# Altium footprint library con-amp.PCBLIB: 295 footprints (part 13 of 19) (continued)
## 63825804 [mil] (continued)
  lines w12: -2070,-303 2070,-303 2070,-230 ; -2070,-300 -2070,-50 ; -2070,50 -2070,305 2070,305 2070,230 ; 1895,-230 2070,-230 ; 1895,-70 2070,-70 ; 1895,70 2070,70 ; 1895,230 2070,230 ; 2070,-230 2070,-185 2070,-115 2070,-70 ; 2070,-70 2070,70 ; 2070,70 2070,115 2070,185 2070,230
Mechanical 16:
  lines w10: -1765,-185 -75,-185 ; -1765,-115 -75,-115 ; -1765,115 -75,115 ; -1765,185 -75,185 ; 75,-185 1765,-185 ; 75,-115 1765,-115 ; 75,115 1765,115 ; 75,185 1765,185

## 63827658 [mil]
pads (139):
  round 62 hole 62: 1(-2100,0)
  round 48 hole 32: 1(-1775,-37.5)
  round 93 hole 93: 1(0,0) 1(2100,0)
  oct 48x48 hole 32: 2(-1725,-112.5) 3(-1675,-37.5) 4(-1625,-112.5) 5(-1575,-37.5) 6(-1525,-112.5) 7(-1475,-37.5) 8(-1425,-112.5) 9(-1375,-37.5) 10(-1325,-112.5) 11(-1275,-37.5) 12(-1225,-112.5) 13(-1175,-37.5) 14(-1125,-112.5) 15(-1075,-37.5) 16(-1025,-112.5) 17(-975,-37.5) 18(-925,-112.5) 19(-875,-37.5) 20(-825,-112.5) 21(-775,-37.5) 22(-725,-112.5) 23(-675,-37.5) 24(-625,-112.5) 25(-575,-37.5) 26(-525,-112.5) 27(-475,-37.5) 28(-425,-112.5) 29(-375,-37.5) 30(-325,-112.5) 31(-275,-37.5) 32(-225,-112.5) 33(-175,-37.5) 34(-125,-112.5) 35(125,-37.5) 36(175,-112.5) 37(225,-37.5) 38(275,-112.5) 39(325,-37.5) 40(375,-112.5) 41(425,-37.5) 42(475,-112.5) 43(525,-37.5) 44(575,-112.5) 45(625,-37.5) 46(675,-112.5) 47(725,-37.5) 48(775,-112.5) 49(825,-37.5) 50(875,-112.5) 51(925,-37.5) 52(975,-112.5) 53(1025,-37.5) 54(1075,-112.5) 55(1125,-37.5) 56(1175,-112.5) 57(1225,-37.5) 58(1275,-112.5) 59(1325,-37.5) 60(1375,-112.5) 61(1425,-37.5) 62(1475,-112.5) 63(1525,-37.5) 64(1575,-112.5) 65(1625,-37.5) 66(1675,-112.5) 67(1725,-37.5) 68(1775,-112.5) 69(-1775,112.5) 70(-1725,37.5) 71(-1675,112.5) 72(-1625,37.5) 73(-1575,112.5) 74(-1525,37.5) 75(-1475,112.5) 76(-1425,37.5) 77(-1375,112.5) 78(-1325,37.5) 79(-1275,112.5) 80(-1225,37.5) 81(-1175,112.5) 82(-1125,37.5) 83(-1075,112.5) 84(-1025,37.5) 85(-975,112.5) 86(-925,37.5) 87(-875,112.5) 88(-825,37.5) 89(-775,112.5) 90(-725,37.5) 91(-675,112.5) 92(-625,37.5) 93(-575,112.5) 94(-525,37.5) 95(-475,112.5) 96(-425,37.5) 97(-375,112.5) 98(-325,37.5) 99(-275,112.5) 100(-225,37.5) 101(-175,112.5) 102(-125,37.5) 103(125,112.5) 104(175,37.5) 105(225,112.5) 106(275,37.5) 107(325,112.5) 108(375,37.5) 109(425,112.5) 110(475,37.5) 111(525,112.5) 112(575,37.5) 113(625,112.5) 114(675,37.5) 115(725,112.5) 116(775,37.5) 117(825,112.5) 118(875,37.5) 119(925,112.5) 120(975,37.5) 121(1025,112.5) 122(1075,37.5) 123(1125,112.5) 124(1175,37.5) 125(1225,112.5) 126(1275,37.5) 127(1325,112.5) 128(1375,37.5) 129(1425,112.5) 130(1475,37.5) 131(1525,112.5) 132(1575,37.5) 133(1625,112.5) 134(1675,37.5) 135(1725,112.5) 136(1775,37.5)
Top Overlay:
  lines w10: -2170,-35 -1870,-35 ; -2170,35 -1870,35 ; -1867,-150 -1867,-35 ; -1867,35 -1867,152 ; 1867,-150 1867,-35 ; 1867,35 1867,152 ; 1870,-35 2170,-35 ; 1870,35 2170,35 ; 2175,-65 2370,-65 2370,65 2175,65 ; -55,-100 -60,-100 cw(c-60,-85) -75,-85 -75,85 cw(c-60,85) -60,100 -55,100 ; -55,-100 0,-100 ; -55,-100 -55,100 ; -55,100 0,100 ; 0,-100 60,-100 ccw(c60,-85) 75,-85 75,85 ccw(c60,85) 60,100 0,100 ; 0,-100 0,100
  lines w12: -1870,-80 -2170,-80 ; -1870,80 -2170,80 ; 1870,-80 2170,-80 ; 1870,80 2170,80 ; -2170,-80 -2170,-35 -2170,35 -2170,80 ; -2170,-80 -2170,-153 2170,-153 2170,-80 ; -2170,80 -2170,155 2170,155 2170,80 ; 2170,-80 2170,-35 2170,35 2170,80
Mechanical 16:
  lines w10: -1865,-35 -75,-35 ; -1865,35 -75,35 ; 75,-35 2165,-35 ; 75,35 1865,35

## 63827818 [mil]
pads (139):
  round 62 hole 62: 1(-2100,0)
  round 48 hole 32: 1(-1775,-37.5)
  round 93 hole 93: 1(0,0) 1(2100,0)
  oct 48x48 hole 32: 2(-1725,-112.5) 3(-1675,-37.5) 4(-1625,-112.5) 5(-1575,-37.5) 6(-1525,-112.5) 7(-1475,-37.5) 8(-1425,-112.5) 9(-1375,-37.5) 10(-1325,-112.5) 11(-1275,-37.5) 12(-1225,-112.5) 13(-1175,-37.5) 14(-1125,-112.5) 15(-1075,-37.5) 16(-1025,-112.5) 17(-975,-37.5) 18(-925,-112.5) 19(-875,-37.5) 20(-825,-112.5) 21(-775,-37.5) 22(-725,-112.5) 23(-675,-37.5) 24(-625,-112.5) 25(-575,-37.5) 26(-525,-112.5) 27(-475,-37.5) 28(-425,-112.5) 29(-375,-37.5) 30(-325,-112.5) 31(-275,-37.5) 32(-225,-112.5) 33(-175,-37.5) 34(-125,-112.5) 35(125,-37.5) 36(175,-112.5) 37(225,-37.5) 38(275,-112.5) 39(325,-37.5) 40(375,-112.5) 41(425,-37.5) 42(475,-112.5) 43(525,-37.5) 44(575,-112.5) 45(625,-37.5) 46(675,-112.5) 47(725,-37.5) 48(775,-112.5) 49(825,-37.5) 50(875,-112.5) 51(925,-37.5) 52(975,-112.5) 53(1025,-37.5) 54(1075,-112.5) 55(1125,-37.5) 56(1175,-112.5) 57(1225,-37.5) 58(1275,-112.5) 59(1325,-37.5) 60(1375,-112.5) 61(1425,-37.5) 62(1475,-112.5) 63(1525,-37.5) 64(1575,-112.5) 65(1625,-37.5) 66(1675,-112.5) 67(1725,-37.5) 68(1775,-112.5) 69(-1775,112.5) 70(-1725,37.5) 71(-1675,112.5) 72(-1625,37.5) 73(-1575,112.5) 74(-1525,37.5) 75(-1475,112.5) 76(-1425,37.5) 77(-1375,112.5) 78(-1325,37.5) 79(-1275,112.5) 80(-1225,37.5) 81(-1175,112.5) 82(-1125,37.5) 83(-1075,112.5) 84(-1025,37.5) 85(-975,112.5) 86(-925,37.5) 87(-875,112.5) 88(-825,37.5) 89(-775,112.5) 90(-725,37.5) 91(-675,112.5) 92(-625,37.5) 93(-575,112.5) 94(-525,37.5) 95(-475,112.5) 96(-425,37.5) 97(-375,112.5) 98(-325,37.5) 99(-275,112.5) 100(-225,37.5) 101(-175,112.5) 102(-125,37.5) 103(125,112.5) 104(175,37.5) 105(225,112.5) 106(275,37.5) 107(325,112.5) 108(375,37.5) 109(425,112.5) 110(475,37.5) 111(525,112.5) 112(575,37.5) 113(625,112.5) 114(675,37.5) 115(725,112.5) 116(775,37.5) 117(825,112.5) 118(875,37.5) 119(925,112.5) 120(975,37.5) 121(1025,112.5) 122(1075,37.5) 123(1125,112.5) 124(1175,37.5) 125(1225,112.5) 126(1275,37.5) 127(1325,112.5) 128(1375,37.5) 129(1425,112.5) 130(1475,37.5) 131(1525,112.5) 132(1575,37.5) 133(1625,112.5) 134(1675,37.5) 135(1725,112.5) 136(1775,37.5)
Top Overlay:
  lines w6: -2290,-85 -2215,-85 -2215,-105 -2205,-105 -2205,-55 -2215,-55 -2215,-75 -2290,-75 -2290,-85 ; -2290,0 -2245,0 -2245,-25 -2235,-25 -2235,0 -2215,0 -2215,-35 -2205,-35 -2205,10 -2290,10 -2290,0 ; -2290,30 -2290,40 -2205,40 -2205,30 -2290,30 ; -2290,60 -2290,105 -2205,105 -2205,95 -2280,95 -2280,60 -2290,60 ; 2205,-105 2205,-95 2280,-95 2280,-60 2290,-60 2290,-105 2205,-105 ; 2205,-40 2205,-30 2290,-30 2290,-40 2205,-40 ; 2205,-10 2290,-10 2290,0 2245,0 2245,25 2235,25 2235,0 2215,0 2215,35 2205,35 2205,-10 ; 2205,55 2205,105 2215,105 2215,85 2290,85 2290,75 2215,75 2215,55 2205,55
  lines w10: -2307,-135 -2307,140 ; -2305,-135 -2185,-135 -2185,-65 -2010,-65 -2010,-35 -2170,-35 -2170,35 -2010,35 -2010,65 -2185,65 -2185,140 -2305,140 ; -2005,-35 -1870,-35 ; -2005,35 -1870,35 ; -1992,-150 -1992,-35 ; -1992,35 -1992,152 ; -1867,-150 -1867,-35 ; -1867,35 -1867,152 ; 1867,-150 1867,-35 ; 1867,35 1867,152 ; 1870,-35 2005,-35 ; 1870,35 2005,35 ; 1992,-152 1992,-35 ; 1992,35 1992,150 ; 2305,-140 2185,-140 2185,-65 2010,-65 2010,-35 2170,-35 2170,35 2010,35 2010,65 2185,65 2185,135 2305,135 ; 2307,-140 2307,135 ; -75,-100 -75,100 75,100 75,-100 -75,-100 ; -55,-15 -55,15 -15,15 -15,55 15,55 15,15 55,15 55,-15 15,-15 15,-55 -15,-55 -15,-15 -55,-15
  lines w12: -2170,-153 2170,-153 ; -2170,-150 -2170,-80 -1995,-80 ; -1995,80 -2170,80 -2170,155 2170,155 ; 1995,-80 2170,-80 2170,-155 ; 1995,80 2170,80 2170,150
Mechanical 16:
  lines w10: -1865,-35 -75,-35 ; -1865,35 -75,35 ; 75,-35 1865,-35 ; 75,35 1865,35

## 63827844 [mil]
pads (131):
  round 62 hole 62: 1(-2000,0)
  round 48 hole 32: 1(-1675,-37.5)
  round 93 hole 93: 1(0,0) 1(2000,0)
  oct 48x48 hole 32: 2(-1625,-112.5) 3(-1575,-37.5) 4(-1525,-112.5) 5(-1475,-37.5) 6(-1425,-112.5) 7(-1375,-37.5) 8(-1325,-112.5) 9(-1275,-37.5) 10(-1225,-112.5) 11(-1175,-37.5) 12(-1125,-112.5) 13(-1075,-37.5) 14(-1025,-112.5) 15(-975,-37.5) 16(-925,-112.5) 17(-875,-37.5) 18(-825,-112.5) 19(-775,-37.5) 20(-725,-112.5) 21(-675,-37.5) 22(-625,-112.5) 23(-575,-37.5) 24(-525,-112.5) 25(-475,-37.5) 26(-425,-112.5) 27(-375,-37.5) 28(-325,-112.5) 29(-275,-37.5) 30(-225,-112.5) 31(-175,-37.5) 32(-125,-112.5) 33(125,-37.5) 34(175,-112.5) 35(225,-37.5) 36(275,-112.5) 37(325,-37.5) 38(375,-112.5) 39(425,-37.5) 40(475,-112.5) 41(525,-37.5) 42(575,-112.5) 43(625,-37.5) 44(675,-112.5) 45(725,-37.5) 46(775,-112.5) 47(825,-37.5) 48(875,-112.5) 49(925,-37.5) 50(975,-112.5) 51(1025,-37.5) 52(1075,-112.5) 53(1125,-37.5) 54(1175,-112.5) 55(1225,-37.5) 56(1275,-112.5) 57(1325,-37.5) 58(1375,-112.5) 59(1425,-37.5) 60(1475,-112.5) 61(1525,-37.5) 62(1575,-112.5) 63(1625,-37.5) 64(1675,-112.5) 65(-1675,112.5) 66(-1625,37.5) 67(-1575,112.5) 68(-1525,37.5) 69(-1475,112.5) 70(-1425,37.5) 71(-1375,112.5) 72(-1325,37.5) 73(-1275,112.5) 74(-1225,37.5) 75(-1175,112.5) 76(-1125,37.5) 77(-1075,112.5) 78(-1025,37.5) 79(-975,112.5) 80(-925,37.5) 81(-875,112.5) 82(-825,37.5) 83(-775,112.5) 84(-725,37.5) 85(-675,112.5) 86(-625,37.5) 87(-575,112.5) 88(-525,37.5) 89(-475,112.5) 90(-425,37.5) 91(-375,112.5) 92(-325,37.5) 93(-275,112.5) 94(-225,37.5) 95(-175,112.5) 96(-125,37.5) 97(125,112.5) 98(175,37.5) 99(225,112.5) 100(275,37.5) 101(325,112.5) 102(375,37.5) 103(425,112.5) 104(475,37.5) 105(525,112.5) 106(575,37.5) 107(625,112.5) 108(675,37.5) 109(725,112.5) 110(775,37.5) 111(825,112.5) 112(875,37.5) 113(925,112.5) 114(975,37.5) 115(1025,112.5) 116(1075,37.5) 117(1125,112.5) 118(1175,37.5) 119(1225,112.5) 120(1275,37.5) 121(1325,112.5) 122(1375,37.5) 123(1425,112.5) 124(1475,37.5) 125(1525,112.5) 126(1575,37.5) 127(1625,112.5) 128(1675,37.5)
Top Overlay:
  lines w10: -2070,-35 -1770,-35 ; -2070,35 -1770,35 ; -1892,-150 -1892,-35 ; -1892,35 -1892,152 ; -1767,-150 -1767,-35 ; -1767,35 -1767,152 ; 1767,-150 1767,-35 ; 1767,35 1767,152 ; 1770,-35 2070,-35 ; 1770,35 2070,35 ; 1892,-150 1892,-35 ; 1892,35 1892,152 ; -75,-100 -75,100 75,100 75,-100 -75,-100 ; -55,-15 -55,15 -15,15 -15,55 15,55 15,15 55,15 55,-15 15,-15 15,-55 -15,-55 -15,-15 -55,-15
  lines w12: -2070,-153 2070,-153 2070,-80 ; -2070,-150 -2070,155 2070,155 2070,80 ; -2065,-80 -1895,-80 ; -2065,80 -1895,80 ; 1895,-80 2070,-80 ; 1895,80 2070,80 ; 2070,-80 2070,-35 2070,35 2070,80
Mechanical 16:
  lines w10: -1765,-35 -75,-35 ; -1765,35 -75,35 ; 75,-35 2065,-35 ; 75,35 2065,35

## 63827848 [mil]
pads (139):
  round 62 hole 62: 1(-2100,0)
  round 48 hole 32: 1(-1775,-37.5)
  round 93 hole 93: 1(0,0) 1(2100,0)
  oct 48x48 hole 32: 2(-1725,-112.5) 3(-1675,-37.5) 4(-1625,-112.5) 5(-1575,-37.5) 6(-1525,-112.5) 7(-1475,-37.5) 8(-1425,-112.5) 9(-1375,-37.5) 10(-1325,-112.5) 11(-1275,-37.5) 12(-1225,-112.5) 13(-1175,-37.5) 14(-1125,-112.5) 15(-1075,-37.5) 16(-1025,-112.5) 17(-975,-37.5) 18(-925,-112.5) 19(-875,-37.5) 20(-825,-112.5) 21(-775,-37.5) 22(-725,-112.5) 23(-675,-37.5) 24(-625,-112.5) 25(-575,-37.5) 26(-525,-112.5) 27(-475,-37.5) 28(-425,-112.5) 29(-375,-37.5) 30(-325,-112.5) 31(-275,-37.5) 32(-225,-112.5) 33(-175,-37.5) 34(-125,-112.5) 35(125,-37.5) 36(175,-112.5) 37(225,-37.5) 38(275,-112.5) 39(325,-37.5) 40(375,-112.5) 41(425,-37.5) 42(475,-112.5) 43(525,-37.5) 44(575,-112.5) 45(625,-37.5) 46(675,-112.5) 47(725,-37.5) 48(775,-112.5) 49(825,-37.5) 50(875,-112.5) 51(925,-37.5) 52(975,-112.5) 53(1025,-37.5) 54(1075,-112.5) 55(1125,-37.5) 56(1175,-112.5) 57(1225,-37.5) 58(1275,-112.5) 59(1325,-37.5) 60(1375,-112.5) 61(1425,-37.5) 62(1475,-112.5) 63(1525,-37.5) 64(1575,-112.5) 65(1625,-37.5) 66(1675,-112.5) 67(1725,-37.5) 68(1775,-112.5) 69(-1775,112.5) 70(-1725,37.5) 71(-1675,112.5) 72(-1625,37.5) 73(-1575,112.5) 74(-1525,37.5) 75(-1475,112.5) 76(-1425,37.5) 77(-1375,112.5) 78(-1325,37.5) 79(-1275,112.5) 80(-1225,37.5) 81(-1175,112.5) 82(-1125,37.5) 83(-1075,112.5) 84(-1025,37.5) 85(-975,112.5) 86(-925,37.5) 87(-875,112.5) 88(-825,37.5) 89(-775,112.5) 90(-725,37.5) 91(-675,112.5) 92(-625,37.5) 93(-575,112.5) 94(-525,37.5) 95(-475,112.5) 96(-425,37.5) 97(-375,112.5) 98(-325,37.5) 99(-275,112.5) 100(-225,37.5) 101(-175,112.5) 102(-125,37.5) 103(125,112.5) 104(175,37.5) 105(225,112.5) 106(275,37.5) 107(325,112.5) 108(375,37.5) 109(425,112.5) 110(475,37.5) 111(525,112.5) 112(575,37.5) 113(625,112.5) 114(675,37.5) 115(725,112.5) 116(775,37.5) 117(825,112.5) 118(875,37.5) 119(925,112.5) 120(975,37.5) 121(1025,112.5) 122(1075,37.5) 123(1125,112.5) 124(1175,37.5) 125(1225,112.5) 126(1275,37.5) 127(1325,112.5) 128(1375,37.5) 129(1425,112.5) 130(1475,37.5) 131(1525,112.5) 132(1575,37.5) 133(1625,112.5) 134(1675,37.5) 135(1725,112.5) 136(1775,37.5)
Top Overlay:
  lines w10: -2170,-35 -1870,-35 ; -2170,35 -1870,35 ; -1992,-150 -1992,-35 ; -1992,35 -1992,152 ; -1867,-150 -1867,-35 ; -1867,35 -1867,152 ; 1867,-150 1867,-35 ; 1867,35 1867,152 ; 1870,-35 2170,-35 ; 1870,35 2170,35 ; 1992,-150 1992,-35 ; 1992,35 1992,152 ; -75,-100 -75,100 75,100 75,-100 -75,-100 ; -55,-15 -55,15 -15,15 -15,55 15,55 15,15 55,15 55,-15 15,-15 15,-55 -15,-55 -15,-15 -55,-15
  lines w12: -2170,-153 2170,-153 2170,-80 ; -2170,-150 -2170,155 2170,155 2170,80 ; -2165,-80 -1995,-80 ; -2165,80 -1995,80 ; 1995,-80 2170,-80 ; 1995,80 2170,80 ; 2170,-80 2170,-35 2170,35 2170,80
Mechanical 16:
  lines w10: -1865,-35 -75,-35 ; -1865,35 -75,35 ; 75,-35 2165,-35 ; 75,35 2165,35

## 73824812 [mil]
pads (75):
  round 96 hole 96: 1(-2200,-100) 1(0,-100)
  round 60 hole 40: 1(1875,-50)
  round 62 hole 62: 1(2200,-100)
  oct 60x60 hole 40: 2(1825,50) 3(1775,-50) 4(1725,50) 5(1675,-50) 6(1625,50) 7(1575,-50) 8(1525,50) 9(1475,-50) 10(1425,50) 11(1375,-50) 12(1325,50) 13(1275,-50) 14(1225,50) 15(1175,-50) 16(1125,50) 17(1075,-50) 18(1025,50) 19(975,-50) 20(925,50) 21(875,-50) 22(825,50) 23(775,-50) 24(725,50) 25(675,-50) 26(625,50) 27(575,-50) 28(525,50) 29(475,-50) 30(425,50) 31(375,-50) 32(325,50) 33(275,-50) 34(225,50) 35(175,-50) 36(125,50) 37(-125,-50) 38(-175,50) 39(-225,-50) 40(-275,50) 41(-325,-50) 42(-375,50) 43(-425,-50) 44(-475,50) 45(-525,-50) 46(-575,50) 47(-625,-50) 48(-675,50) 49(-725,-50) 50(-775,50) 51(-825,-50) 52(-875,50) 53(-925,-50) 54(-975,50) 55(-1025,-50) 56(-1075,50) 57(-1125,-50) 58(-1175,50) 59(-1225,-50) 60(-1275,50) 61(-1325,-50) 62(-1375,50) 63(-1425,-50) 64(-1475,50) 65(-1525,-50) 66(-1575,50) 67(-1625,-50) 68(-1675,50) 69(-1725,-50) 70(-1775,50) 71(-1825,-50) 72(-1875,50)
Top Overlay:
  rectangle: 2060,-245 2075,-155
  lines w6: -2140,-435 -2140,-430 -2140,-155 -1940,-155 ; -2110,-460 -2070,-500 -2070,-600 ; -2035,-600 -2035,-515 -1940,-515 ; 1940,-515 2035,-515 2035,-600 ; 1940,-155 2140,-155 2140,-430 ; 2070,-600 2070,-500 2110,-460
  lines w10: 1950,98 -2270,98 -2270,-602 -2235,-602 -2235,-430 -2140,-430 -2110,-460 -2150,-500 -2150,-602 -1940,-602 -1940,-515 -1940,-157 1940,-157 1940,-515 1940,-602 2150,-602 2150,-500 2110,-460 2140,-430 2235,-430 2235,-602 2270,-602 2270,98 2050,98
  lines w12: 1950,96.06 ccw(c2000,106.06) 2050,96.06

## 73824862 [mil]
pads (75):
  round 96 hole 96: 1(-2200,-100) 1(0,-100)
  round 60 hole 40: 1(1875,-50)
  round 62 hole 62: 1(2200,-100)
  oct 60x60 hole 40: 2(1825,50) 3(1775,-50) 4(1725,50) 5(1675,-50) 6(1625,50) 7(1575,-50) 8(1525,50) 9(1475,-50) 10(1425,50) 11(1375,-50) 12(1325,50) 13(1275,-50) 14(1225,50) 15(1175,-50) 16(1125,50) 17(1075,-50) 18(1025,50) 19(975,-50) 20(925,50) 21(875,-50) 22(825,50) 23(775,-50) 24(725,50) 25(675,-50) 26(625,50) 27(575,-50) 28(525,50) 29(475,-50) 30(425,50) 31(375,-50) 32(325,50) 33(275,-50) 34(225,50) 35(175,-50) 36(125,50) 37(-125,-50) 38(-175,50) 39(-225,-50) 40(-275,50) 41(-325,-50) 42(-375,50) 43(-425,-50) 44(-475,50) 45(-525,-50) 46(-575,50) 47(-625,-50) 48(-675,50) 49(-725,-50) 50(-775,50) 51(-825,-50) 52(-875,50) 53(-925,-50) 54(-975,50) 55(-1025,-50) 56(-1075,50) 57(-1125,-50) 58(-1175,50) 59(-1225,-50) 60(-1275,50) 61(-1325,-50) 62(-1375,50) 63(-1425,-50) 64(-1475,50) 65(-1525,-50) 66(-1575,50) 67(-1625,-50) 68(-1675,50) 69(-1725,-50) 70(-1775,50) 71(-1825,-50) 72(-1875,50)
Top Overlay:
  rectangle: 2060,-245 2075,-155
  lines w6: -2140,-330 -2140,-155 -1940,-155 ; -2110,-360 -2070,-400 -2070,-500 ; -2035,-500 -2035,-415 -1940,-415 ; 1940,-415 2035,-415 2035,-500 ; 1940,-155 2140,-155 2140,-330 ; 2070,-500 2070,-400 2110,-360
  lines w10: 1950,98 -2270,98 -2270,-502 -2235,-502 -2235,-330 -2140,-330 -2110,-360 -2150,-400 -2150,-502 -1940,-502 -1940,-415 -1940,-157 1940,-157 1940,-415 1940,-502 2150,-502 2150,-400 2110,-360 2140,-330 2235,-330 2235,-502 2270,-502 2270,98 2050,98
  lines w12: 1950,96.06 ccw(c2000,106.06) 2050,96.06

## 73826962 [mil]
pads (75):
  round 93 hole 93: 1(-2200,0)
  round 100 hole 100: 1(0,0)
  round 60 hole 40: 1(1875,-50)
  round 62 hole 62: 1(2200,0)
  oct 60x60 hole 40: 2(1825,50) 3(1775,-50) 4(1725,50) 5(1675,-50) 6(1625,50) 7(1575,-50) 8(1525,50) 9(1475,-50) 10(1425,50) 11(1375,-50) 12(1325,50) 13(1275,-50) 14(1225,50) 15(1175,-50) 16(1125,50) 17(1075,-50) 18(1025,50) 19(975,-50) 20(925,50) 21(875,-50) 22(825,50) 23(775,-50) 24(725,50) 25(675,-50) 26(625,50) 27(575,-50) 28(525,50) 29(475,-50) 30(425,50) 31(375,-50) 32(325,50) 33(275,-50) 34(225,50) 35(175,-50) 36(125,50) 37(-125,-50) 38(-175,50) 39(-225,-50) 40(-275,50) 41(-325,-50) 42(-375,50) 43(-425,-50) 44(-475,50) 45(-525,-50) 46(-575,50) 47(-625,-50) 48(-675,50) 49(-725,-50) 50(-775,50) 51(-825,-50) 52(-875,50) 53(-925,-50) 54(-975,50) 55(-1025,-50) 56(-1075,50) 57(-1125,-50) 58(-1175,50) 59(-1225,-50) 60(-1275,50) 61(-1325,-50) 62(-1375,50) 63(-1425,-50) 64(-1475,50) 65(-1525,-50) 66(-1575,50) 67(-1625,-50) 68(-1675,50) 69(-1725,-50) 70(-1775,50) 71(-1825,-50) 72(-1875,50)
Top Overlay:
  lines w6: -2150,-25 -2150,75 -1950,75 -1950,-65 -2035,-65 -2035,-25 -2150,-25 ; 1950,-65 1950,75 2150,75 2150,-25 2035,-25 2035,-65 1950,-65
  lines w10: -2270,-187 -1940,-187 -1940,-207 1940,-207 1940,-187 2270,-187 2270,98 1935,98 1935,78 -1935,78 -1935,98 -2270,98 -2270,-187
  lines w16: -2175,-245 -2095,-180 ccw(c-2132.5,-139.87) -2130,-85 -2160,-85 -2160,85 -2075,85 ; 2075,85 2160,85 2160,-85 2130,-85 ccw(c2132.5,-139.87) 2095,-180 2175,-245
Mechanical 16:
  lines w6: -2270,-30 -2170,-30 ; -2270,30 -2170,30 ; -1945,-30 -62,-30 ; -1945,30 -62,30 ; 1945,-30 62,-30 ; 1945,30 62,30 ; 2170,-30 2270,-30 ; 2170,30 2270,30 ; -62,-30 62,-30 ; -62,-30 -62,30 ; -62,30 62,30 ; 62,-30 62,30

## 73826982 [mil]
pads (75):
  round 57 hole 57: 1(-2200,0) 1(2200,0)
  round 60 hole 40: 1(-1875,50)
  round 100 hole 100: 1(0,0)
  oct 60x60 hole 40: 2(-1825,-50) 3(-1775,50) 4(-1725,-50) 5(-1675,50) 6(-1625,-50) 7(-1575,50) 8(-1525,-50) 9(-1475,50) 10(-1425,-50) 11(-1375,50) 12(-1325,-50) 13(-1275,50) 14(-1225,-50) 15(-1175,50) 16(-1125,-50) 17(-1075,50) 18(-1025,-50) 19(-975,50) 20(-925,-50) 21(-875,50) 22(-825,-50) 23(-775,50) 24(-725,-50) 25(-675,50) 26(-625,-50) 27(-575,50) 28(-525,-50) 29(-475,50) 30(-425,-50) 31(-375,50) 32(-325,-50) 33(-275,50) 34(-225,-50) 35(-175,50) 36(-125,-50) 37(125,50) 38(175,-50) 39(225,50) 40(275,-50) 41(325,50) 42(375,-50) 43(425,50) 44(475,-50) 45(525,50) 46(575,-50) 47(625,50) 48(675,-50) 49(725,50) 50(775,-50) 51(825,50) 52(875,-50) 53(925,50) 54(975,-50) 55(1025,50) 56(1075,-50) 57(1125,50) 58(1175,-50) 59(1225,50) 60(1275,-50) 61(1325,50) 62(1375,-50) 63(1425,50) 64(1475,-50) 65(1525,50) 66(1575,-50) 67(1625,50) 68(1675,-50) 69(1725,50) 70(1775,-50) 71(1825,50) 72(1875,-50)
Top Overlay:
  lines w6: -2150,-25 -2150,75 -1950,75 -1950,-65 -2035,-65 -2035,-25 -2150,-25 ; 1950,-65 1950,75 2150,75 2150,-25 2035,-25 2035,-65 1950,-65
  lines w10: -2270,-187 -1940,-187 -1940,-207 1940,-207 1940,-187 2270,-187 2270,98 1935,98 1935,78 -1935,78 -1935,98 -2270,98 -2270,-187
  lines w16: -2175,-245 -2095,-180 ccw(c-2132.5,-139.87) -2130,-85 -2160,-85 -2160,85 -2075,85 ; 2075,85 2160,85 2160,-85 2130,-85 ccw(c2132.5,-139.87) 2095,-180 2175,-245
Mechanical 16:
  lines w6: -2270,-30 -2170,-30 ; -2270,30 -2170,30 ; -1945,-30 -62,-30 ; -1945,30 -62,30 ; 1945,-30 62,-30 ; 1945,30 62,30 ; 2170,-30 2270,-30 ; 2170,30 2270,30 ; -62,-30 62,-30 ; -62,-30 -62,30 ; -62,30 62,30 ; 62,-30 62,30

## 73827652 [mil]
pads (147):
  round 62 hole 62: 1(-2200,0)
  round 48 hole 32: 1(-1875,-37.5)
  round 93 hole 93: 1(0,0) 1(2200,0)
  oct 48x48 hole 32: 2(-1825,-112.5) 3(-1775,-37.5) 4(-1725,-112.5) 5(-1675,-37.5) 6(-1625,-112.5) 7(-1575,-37.5) 8(-1525,-112.5) 9(-1475,-37.5) 10(-1425,-112.5) 11(-1375,-37.5) 12(-1325,-112.5) 13(-1275,-37.5) 14(-1225,-112.5) 15(-1175,-37.5) 16(-1125,-112.5) 17(-1075,-37.5) 18(-1025,-112.5) 19(-975,-37.5) 20(-925,-112.5) 21(-875,-37.5) 22(-825,-112.5) 23(-775,-37.5) 24(-725,-112.5) 25(-675,-37.5) 26(-625,-112.5) 27(-575,-37.5) 28(-525,-112.5) 29(-475,-37.5) 30(-425,-112.5) 31(-375,-37.5) 32(-325,-112.5) 33(-275,-37.5) 34(-225,-112.5) 35(-175,-37.5) 36(-125,-112.5) 37(125,-37.5) 38(175,-112.5) 39(225,-37.5) 40(275,-112.5) 41(325,-37.5) 42(375,-112.5) 43(425,-37.5) 44(475,-112.5) 45(525,-37.5) 46(575,-112.5) 47(625,-37.5) 48(675,-112.5) 49(725,-37.5) 50(775,-112.5) 51(825,-37.5) 52(875,-112.5) 53(925,-37.5) 54(975,-112.5) 55(1025,-37.5) 56(1075,-112.5) 57(1125,-37.5) 58(1175,-112.5) 59(1225,-37.5) 60(1275,-112.5) 61(1325,-37.5) 62(1375,-112.5) 63(1425,-37.5) 64(1475,-112.5) 65(1525,-37.5) 66(1575,-112.5) 67(1625,-37.5) 68(1675,-112.5) 69(1725,-37.5) 70(1775,-112.5) 71(1825,-37.5) 72(1875,-112.5) 73(-1875,112.5) 74(-1825,37.5) 75(-1775,112.5) 76(-1725,37.5) 77(-1675,112.5) 78(-1625,37.5) 79(-1575,112.5) 80(-1525,37.5) 81(-1475,112.5) 82(-1425,37.5) 83(-1375,112.5) 84(-1325,37.5) 85(-1275,112.5) 86(-1225,37.5) 87(-1175,112.5) 88(-1125,37.5) 89(-1075,112.5) 90(-1025,37.5) 91(-975,112.5) 92(-925,37.5) 93(-875,112.5) 94(-825,37.5) 95(-775,112.5) 96(-725,37.5) 97(-675,112.5) 98(-625,37.5) 99(-575,112.5) 100(-525,37.5) 101(-475,112.5) 102(-425,37.5) 103(-375,112.5) 104(-325,37.5) 105(-275,112.5) 106(-225,37.5) 107(-175,112.5) 108(-125,37.5) 109(125,112.5) 110(175,37.5) 111(225,112.5) 112(275,37.5) 113(325,112.5) 114(375,37.5) 115(425,112.5) 116(475,37.5) 117(525,112.5) 118(575,37.5) 119(625,112.5) 120(675,37.5) 121(725,112.5) 122(775,37.5) 123(825,112.5) 124(875,37.5) 125(925,112.5) 126(975,37.5) 127(1025,112.5) 128(1075,37.5) 129(1125,112.5) 130(1175,37.5) 131(1225,112.5) 132(1275,37.5) 133(1325,112.5) 134(1375,37.5) 135(1425,112.5) 136(1475,37.5) 137(1525,112.5) 138(1575,37.5) 139(1625,112.5) 140(1675,37.5) 141(1725,112.5) 142(1775,37.5) 143(1825,112.5) 144(1875,37.5)
Top Overlay:
  lines w10: -2270,-35 -1970,-35 ; -2270,35 -1970,35 ; -1967,-150 -1967,-35 ; -1967,35 -1967,152 ; 1967,-150 1967,-35 ; 1967,35 1967,152 ; 1970,-35 2270,-35 ; 1970,35 2270,35 ; 2275,-65 2470,-65 2470,65 2275,65 ; -55,-100 -60,-100 cw(c-60,-85) -75,-85 -75,85 cw(c-60,85) -60,100 -55,100 ; -55,-100 0,-100 ; -55,-100 -55,100 ; -55,100 0,100 ; 0,-100 60,-100 ccw(c60,-85) 75,-85 75,85 ccw(c60,85) 60,100 0,100 ; 0,-100 0,100
  lines w12: -1970,-80 -2270,-80 ; -1970,80 -2270,80 ; 1970,-80 2270,-80 ; 1970,80 2270,80 ; -2270,-80 -2270,-35 -2270,35 -2270,80 ; -2270,-80 -2270,-153 2270,-153 2270,-80 ; -2270,80 -2270,155 2270,155 2270,80 ; 2270,-80 2270,-35 2270,35 2270,80
Mechanical 16:
  lines w10: -1965,-35 -75,-35 ; -1965,35 -75,35 ; 75,-35 2265,-35 ; 75,35 2265,35